# Altium footprint library JDR2812（公开）.PcbLib: 142 footprints (part 8 of 9)
Each footprint in its own frame and in the unit in brackets; x right, y up, seen from the top. Pads: shape width x height; smd on the part's side, far side on the other; paste and mask are expansions set on the pad; w line width, h text height; cw(c..) or ccw(c..) is an arc to the next point about the centre after c.
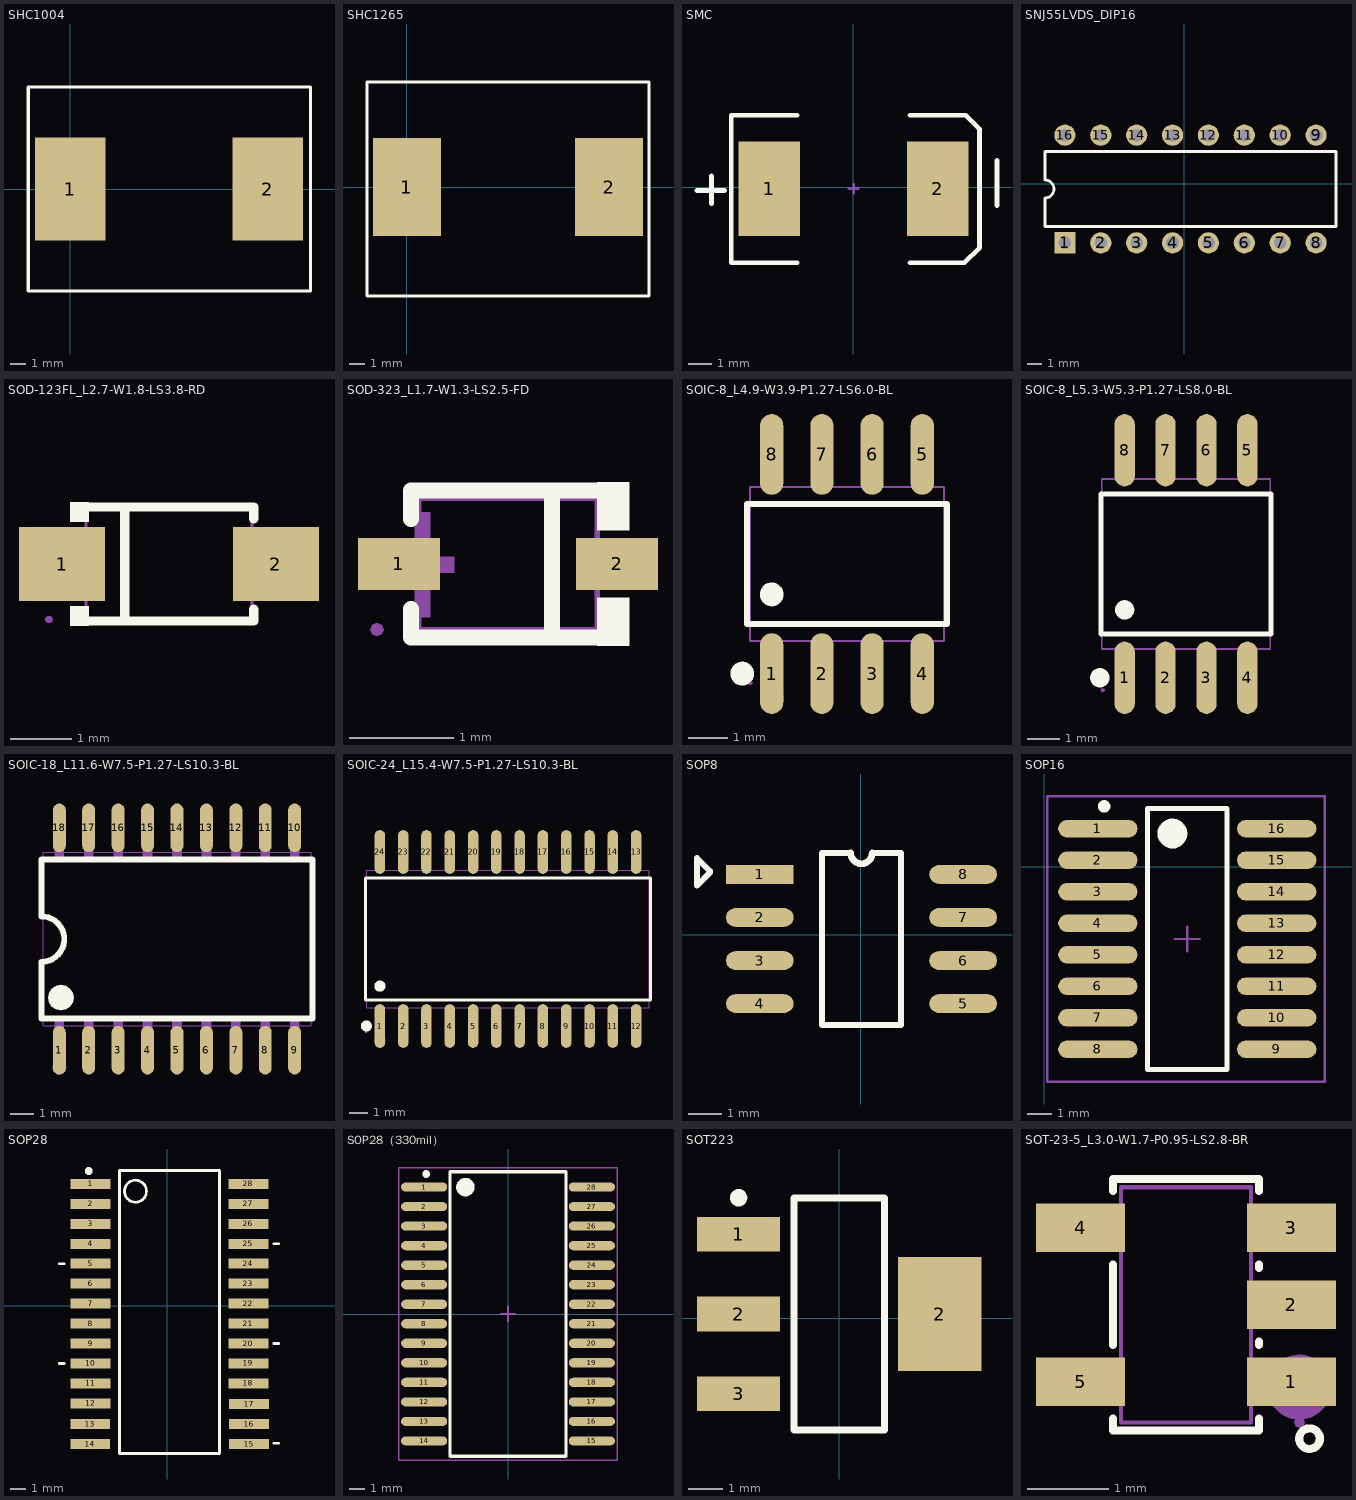
[diagram p7: the footprints below, top view; thin cyan lines are the x and y axes]

## SHC1004 [mm]
pads (2):
  rect 4.5x6.5 smd: 1(0,0) 2(12.522,0)
Top Overlay:
  lines w0.2: -2.667,-6.477 15.24,-6.477 15.24,6.477 -2.667,6.477 -2.667,-6.477

## SHC1265 [mm]
pads (2):
  rect 4.5x6.5 smd: 1(0,0) 2(13.411,0)
Top Overlay:
  lines w0.2: -2.667,-7.239 -2.667,6.985 16.078,6.985 16.078,-7.239 -2.667,-7.239

## SMC [mm]
pads (2):
  rect 2.6x4 smd: 1(-3.526,-0.051) 2(3.577,-0.051)
Top Overlay:
  lines w0.2: -6.579,-0.127 -5.41,-0.127 ; -5.969,-0.686 -5.969,0.483 ; -2.35,-3.175 -5.131,-3.175 -5.131,3.048 -2.35,3.048 ; 2.4,-3.175 4.699,-3.175 5.334,-2.54 5.334,2.462 4.754,3.048 2.4,3.048 ; 6.071,-0.762 6.071,1.143
Mechanical 1:
  lines w0.1: -0.175,-0.051 0.225,-0.051 ; 0.025,-0.251 0.025,0.149

## SNJ55LVDS_DIP16 [mm]
pads (16):
  rect 1.5x1.5 hole 0.9: 1(-8.458,-4.191)
  round 1.5 hole 0.9: 2(-5.918,-4.191) 3(-3.378,-4.191) 4(-0.838,-4.191) 5(1.702,-4.191) 6(4.242,-4.191) 7(6.782,-4.191) 8(9.322,-4.191) 9(9.322,3.429) 10(6.782,3.429) 11(4.242,3.429) 12(1.702,3.429) 13(-0.838,3.429) 14(-3.378,3.429) 15(-5.918,3.429) 16(-8.458,3.429)
Top Overlay:
  lines w0.2: -9.868,-3.031 10.732,-3.031 10.732,2.269 -9.868,2.269 -9.868,0.254 cw(c-9.868,-0.381) -9.868,-1.016 -9.868,-3.031

## SOD-123FL_L2.7-W1.8-LS3.8-RD [mm]
pads (2):
  rect 1.4x1.2 smd: 1(-1193.1,-1192.798) 2(-1189.63,-1192.798)
Top Overlay:
  region: -1192.665,-1191.795 -1192.665,-1192.115 -1192.97,-1192.115 -1192.97,-1191.795
  region: -1192.665,-1193.8 -1192.665,-1193.48 -1192.97,-1193.48 -1192.97,-1193.8
  lines w0.152: -1192.741,-1193.724 -1189.989,-1193.724 -1189.989,-1193.531 ; -1192.741,-1191.871 -1189.989,-1191.871 -1189.989,-1192.064 ; -1192.082,-1193.674 -1192.082,-1191.921
Mechanical 6:
  region: -1193.397,-1192.671 -1193.397,-1192.863 -1192.629,-1192.863 -1192.629,-1192.671
  region: -1189.33,-1192.702 -1189.33,-1192.894 -1190.098,-1192.894 -1190.098,-1192.702
  region: -1189.618,-1193.182 -1189.81,-1193.182 -1189.81,-1192.414 -1189.618,-1192.414
Mechanical 15:
  region: -1193.251,-1193.697 -1193.269,-1193.653 -1193.315,-1193.634 -1193.361,-1193.653 -1193.379,-1193.697 -1193.379,-1193.698 -1193.361,-1193.742 -1193.315,-1193.761 -1193.269,-1193.742
  region: -1189.415,-1193.273 -1190.215,-1193.273 -1190.215,-1192.323 -1189.415,-1192.323
  region: -1193.315,-1192.323 -1192.515,-1192.323 -1192.515,-1193.273 -1193.315,-1193.273
  lines w0.051: -1192.715,-1193.698 -1192.715,-1191.898 -1190.015,-1191.898 -1190.015,-1193.698 -1192.715,-1193.698

## SOD-323_L1.7-W1.3-LS2.5-FD [mm]
pads (2):
  rect 0.78x0.5 smd: 1(-1193.41,-1193.023) 2(-1191.33,-1193.023)
Top Overlay:
  region: -1191.52,-1193.343 -1191.215,-1193.343 -1191.215,-1193.8 -1191.52,-1193.8
  region: -1191.52,-1192.703 -1191.215,-1192.703 -1191.215,-1192.245 -1191.52,-1192.245
  lines w0.152: -1193.296,-1193.453 -1193.296,-1193.724 -1191.444,-1193.724 ; -1193.296,-1192.592 -1193.296,-1192.321 -1191.444,-1192.321 ; -1191.949,-1193.724 -1191.949,-1192.321
Mechanical 6:
  region: -1193.259,-1193.531 -1193.259,-1192.531 -1193.109,-1192.531 -1193.109,-1193.531
  region: -1191.054,-1193.098 -1191.054,-1192.948 -1191.654,-1192.948 -1191.654,-1193.098
  region: -1193.484,-1193.106 -1193.484,-1192.956 -1192.884,-1192.956 -1192.884,-1193.106
Mechanical 15:
  region: -1191.41,-1193.183 -1191.53,-1193.183 -1191.53,-1192.863 -1191.41,-1192.863
  region: -1191.12,-1193.183 -1191.42,-1193.183 -1191.42,-1192.863 -1191.12,-1192.863
  region: -1193.33,-1193.183 -1193.21,-1193.183 -1193.21,-1192.863 -1193.33,-1192.863
  region: -1193.62,-1193.183 -1193.32,-1193.183 -1193.32,-1192.863 -1193.62,-1192.863
  region: -1193.555,-1193.648 -1193.574,-1193.602 -1193.62,-1193.583 -1193.666,-1193.602 -1193.685,-1193.648 -1193.666,-1193.694 -1193.62,-1193.713 -1193.574,-1193.694
  lines w0.051: -1193.22,-1193.648 -1193.22,-1192.398 -1191.52,-1192.398 -1191.52,-1193.648 -1193.22,-1193.648

## SOIC-8_L4.9-W3.9-P1.27-LS6.0-BL [mm]
pads (8):
  oval 0.588x2.045 smd: 1(-1192.903,-1192.777) 2(-1191.633,-1192.777) 3(-1190.363,-1192.777) 4(-1189.093,-1192.777) 5(-1189.093,-1187.233) 6(-1190.363,-1187.233) 7(-1191.633,-1187.233) 8(-1192.903,-1187.233)
Top Overlay:
  circle w0.3: c-1192.903,-1190.774 r0.15
  circle w0.3: c-1193.65,-1192.777 r0.15
  lines w0.152: -1193.525,-1191.526 -1193.525,-1188.484 -1188.472,-1188.484 -1188.472,-1191.526 -1193.525,-1191.526
Mechanical 6:
  circle w0.3: c-1192.903,-1193.405 r0.15
Mechanical 15:
  region: -1193.384,-1193.005 -1193.403,-1192.96 -1193.448,-1192.941 -1193.494,-1192.96 -1193.513,-1193.005 -1193.494,-1193.05 -1193.448,-1193.069 -1193.403,-1193.05
  region: -1193.113,-1193.005 -1193.113,-1192.17 -1192.693,-1192.17 -1192.693,-1193.005
  region: -1193.113,-1192.18 -1193.113,-1191.945 -1192.693,-1191.945 -1192.693,-1192.18
  region: -1191.843,-1193.005 -1191.843,-1192.17 -1191.423,-1192.17 -1191.423,-1193.005
  region: -1191.843,-1192.18 -1191.843,-1191.945 -1191.423,-1191.945 -1191.423,-1192.18
  region: -1190.573,-1193.005 -1190.573,-1192.17 -1190.153,-1192.17 -1190.153,-1193.005
  region: -1190.573,-1192.18 -1190.573,-1191.945 -1190.153,-1191.945 -1190.153,-1192.18
  region: -1189.303,-1193.005 -1189.303,-1192.17 -1188.883,-1192.17 -1188.883,-1193.005
  region: -1189.303,-1192.18 -1189.303,-1191.945 -1188.883,-1191.945 -1188.883,-1192.18
  region: -1193.113,-1187.005 -1193.113,-1187.84 -1192.693,-1187.84 -1192.693,-1187.005
  region: -1193.113,-1187.83 -1193.113,-1188.065 -1192.693,-1188.065 -1192.693,-1187.83
  region: -1191.843,-1187.005 -1191.843,-1187.84 -1191.423,-1187.84 -1191.423,-1187.005
  region: -1191.843,-1187.83 -1191.843,-1188.065 -1191.423,-1188.065 -1191.423,-1187.83
  region: -1190.573,-1187.005 -1190.573,-1187.84 -1190.153,-1187.84 -1190.153,-1187.005
  region: -1190.573,-1187.83 -1190.573,-1188.065 -1190.153,-1188.065 -1190.153,-1187.83
  region: -1189.303,-1187.005 -1189.303,-1187.84 -1188.883,-1187.84 -1188.883,-1187.005
  region: -1189.303,-1187.83 -1189.303,-1188.065 -1188.883,-1188.065 -1188.883,-1187.83
  lines w0.051: -1193.448,-1191.955 -1193.448,-1188.055 -1188.548,-1188.055 -1188.548,-1191.955 -1193.448,-1191.955

## SOIC-8_L5.3-W5.3-P1.27-LS8.0-BL [mm]
pads (8):
  oval 0.63x2.25 smd: 1(-1192.883,-1192.675) 2(-1191.613,-1192.675) 3(-1190.343,-1192.675) 4(-1189.073,-1192.675) 5(-1189.073,-1185.615) 6(-1190.343,-1185.615) 7(-1191.613,-1185.615) 8(-1192.883,-1185.615)
Top Overlay:
  circle w0.3: c-1193.65,-1192.675 r0.15
  circle w0.3: c-1192.883,-1190.569 r0.15
  lines w0.152: -1193.616,-1191.321 -1188.339,-1191.321 -1188.339,-1186.969 -1193.616,-1186.969 -1193.616,-1191.321
Mechanical 6:
  circle w0.3: c-1192.883,-1193.495 r0.15
Mechanical 15:
  region: -1189.298,-1185.835 -1189.298,-1186.55 -1188.848,-1186.55 -1188.848,-1185.835
  region: -1189.298,-1185.195 -1189.298,-1185.845 -1188.848,-1185.845 -1188.848,-1185.195
  region: -1190.568,-1185.835 -1190.568,-1186.55 -1190.118,-1186.55 -1190.118,-1185.835
  region: -1190.568,-1185.195 -1190.568,-1185.845 -1190.118,-1185.845 -1190.118,-1185.195
  region: -1191.838,-1185.835 -1191.838,-1186.55 -1191.388,-1186.55 -1191.388,-1185.835
  region: -1191.838,-1185.195 -1191.838,-1185.845 -1191.388,-1185.845 -1191.388,-1185.195
  region: -1193.108,-1185.835 -1193.108,-1186.55 -1192.658,-1186.55 -1192.658,-1185.835
  region: -1193.108,-1185.195 -1193.108,-1185.845 -1192.658,-1185.845 -1192.658,-1185.195
  region: -1189.298,-1192.455 -1189.298,-1191.74 -1188.848,-1191.74 -1188.848,-1192.455
  region: -1189.298,-1193.095 -1189.298,-1192.445 -1188.848,-1192.445 -1188.848,-1193.095
  region: -1190.568,-1192.455 -1190.568,-1191.74 -1190.118,-1191.74 -1190.118,-1192.455
  region: -1190.568,-1193.095 -1190.568,-1192.445 -1190.118,-1192.445 -1190.118,-1193.095
  region: -1191.838,-1192.455 -1191.838,-1191.74 -1191.388,-1191.74 -1191.388,-1192.455
  region: -1191.838,-1193.095 -1191.838,-1192.445 -1191.388,-1192.445 -1191.388,-1193.095
  region: -1193.108,-1192.455 -1193.108,-1191.74 -1192.658,-1191.74 -1192.658,-1192.455
  region: -1193.108,-1193.095 -1193.108,-1192.445 -1192.658,-1192.445 -1192.658,-1193.095
  region: -1193.498,-1193.065 -1193.517,-1193.019 -1193.563,-1193 -1193.609,-1193.019 -1193.628,-1193.065 -1193.609,-1193.111 -1193.563,-1193.13 -1193.517,-1193.111
  lines w0.051: -1193.593,-1191.785 -1188.363,-1191.785 -1188.363,-1186.505 -1193.593,-1186.505 -1193.593,-1191.785

## SOIC-18_L11.6-W7.5-P1.27-LS10.3-BL [mm]
pads (18):
  oval 0.56x2.1 smd: 1(-1193.038,-1192.75) 2(-1191.768,-1192.75) 3(-1190.498,-1192.75) 4(-1189.228,-1192.75) 5(-1187.958,-1192.75) 6(-1186.688,-1192.75) 7(-1185.418,-1192.75) 8(-1184.148,-1192.75) 9(-1182.878,-1192.75) 10(-1182.878,-1183.15) 11(-1184.148,-1183.15) 12(-1185.418,-1183.15) 13(-1186.688,-1183.15) 14(-1187.958,-1183.15) 15(-1189.228,-1183.15) 16(-1190.498,-1183.15) 17(-1191.768,-1183.15) 18(-1193.038,-1183.15)
Top Overlay:
  region: -1193.518,-1190.48 -1193.519,-1190.476 -1193.477,-1190.265 -1193.357,-1190.087 -1193.179,-1189.968 -1192.968,-1189.926 -1192.757,-1189.968 -1192.579,-1190.087 -1192.459,-1190.265 -1192.417,-1190.476 -1192.418,-1190.48 -1192.417,-1190.484 -1192.459,-1190.694 -1192.579,-1190.873 -1192.757,-1190.992 -1192.968,-1191.034 -1193.179,-1190.992 -1193.357,-1190.873 -1193.477,-1190.694 -1193.519,-1190.484
  lines w0.254: -1193.8,-1188.961 -1193.8,-1191.379 -1182.116,-1191.379 -1182.116,-1184.521 -1193.8,-1184.521 -1193.8,-1186.977 cw(c-1193.8,-1187.955) -1193.8,-1188.933
Mechanical 6:
  circle w0.3: c-1193.038,-1193.5 r0.15
Mechanical 15:
  drawing of 41 lines, arcs and shapes, not listed

## SOIC-24_L15.4-W7.5-P1.27-LS10.3-BL [mm]
pads (24):
  oval 0.574x2.388 smd: 1(-1192.91,-1192.606) 2(-1191.64,-1192.606) 3(-1190.37,-1192.606) 4(-1189.1,-1192.606) 5(-1187.83,-1192.606) 6(-1186.56,-1192.606) 7(-1185.29,-1192.606) 8(-1184.02,-1192.606) 9(-1182.75,-1192.606) 10(-1181.48,-1192.606) 11(-1180.21,-1192.606) 12(-1178.94,-1192.606) 13(-1178.94,-1183.118) 14(-1180.21,-1183.118) 15(-1181.48,-1183.118) 16(-1182.75,-1183.118) 17(-1184.02,-1183.118) 18(-1185.29,-1183.118) 19(-1186.56,-1183.118) 20(-1187.83,-1183.118) 21(-1189.1,-1183.118) 22(-1190.37,-1183.118) 23(-1191.64,-1183.118) 24(-1192.91,-1183.118)
Top Overlay:
  circle w0.3: c-1192.91,-1190.431 r0.15
  circle w0.3: c-1193.65,-1192.606 r0.15
  lines w0.152: -1193.702,-1191.183 -1193.702,-1184.541 -1178.149,-1184.541 -1178.149,-1191.183 -1193.702,-1191.183
Mechanical 6:
  circle w0.3: c-1192.91,-1193.412 r0.15
Mechanical 15:
  drawing of 53 lines, arcs and shapes, not listed

## SOP8 [mm]
pads (8):
  rect 2x0.55 smd: 1(-2.972,1.778)
  oval 2x0.55 smd: 2(-2.972,0.508) 3(-2.972,-0.762) 4(-2.972,-2.032) 5(3.028,-2.032) 6(3.028,-0.762) 7(3.028,0.508) 8(3.028,1.778)
Top Overlay:
  lines w0.178: -4.445,1.829 -4.826,1.448 -4.826,2.261 -4.445,1.88 ; -0.289,2.413 -1.137,2.413 -1.137,-2.667 1.193,-2.667 1.193,2.413 0.346,2.413
  lines w0.2: -0.289,2.413 ccw(c0.028,2.413) 0.346,2.413

## SOP16 [mm]
pads (16):
  oval 3.2x0.7 smd: 1(2.162,1.524) 2(2.162,0.254) 3(2.162,-1.016) 4(2.162,-2.286) 5(2.162,-3.556) 6(2.162,-4.826) 7(2.162,-6.096) 8(2.162,-7.366) 9(9.37,-7.366) 10(9.37,-6.096) 11(9.37,-4.826) 12(9.37,-3.556) 13(9.37,-2.286) 14(9.37,-1.016) 15(9.37,0.254) 16(9.37,1.524)
Top Overlay:
  circle w0.25: c2.416,2.424 r0.125
  circle w0.6: c5.166,1.329 r0.3
  lines w0.2: 4.166,-8.171 4.166,2.329 7.366,2.329 7.366,-8.171 4.166,-8.171
Mechanical 15:
  lines w0.1: 5.266,-2.921 6.266,-2.921 ; 5.766,-3.421 5.766,-2.421 ; 0.127,-8.671 0.127,2.829 11.303,2.829 11.303,-8.671 0.127,-8.671

## SOP28 [mil]
pads (28):
  rect 100x25 smd: 1(-192,305) 2(-192,255) 3(-192,205) 4(-192,155) 5(-192,105) 6(-192,55) 7(-192,5) 8(-192,-45) 9(-192,-95) 10(-192,-145) 11(-192,-195) 12(-192,-245) 13(-193,-297) 14(-193,-347) 15(205,-347) 16(205,-297) 17(205,-247) 18(203.28,-195) 19(203.28,-145) 20(203.28,-95) 21(203.28,-45) 22(203.28,5) 23(203.28,55) 24(203.28,105) 25(203.28,155) 26(203.28,205) 27(203.28,255) 28(203.28,305)
Top Overlay:
  circle w9.84: c-196.94,337.28 r4.92
  circle w7: c-79.56,286.75 r27.56
  lines w7: -270.86,-145 -258.36,-145 ; -270.86,105 -258.36,105 ; 267.14,-345 279.64,-345 ; 267.14,-95 279.64,-95 ; 267.14,155 279.64,155 ; -119.36,-371 -119.36,339 130.64,339 130.64,-371 -119.36,-371

## SOP28（330mil） [mm] "SOP, 28-Leads, Body 18.5x8.6mm (max), Pitch 1.27mm, IPC Medium Density"
height 2.65
pads (28):
  oval 3x0.6 smd: 1(-5.452,8.255) 2(-5.452,6.985) 3(-5.452,5.715) 4(-5.452,4.445) 5(-5.452,3.175) 6(-5.452,1.905) 7(-5.452,0.635) 8(-5.452,-0.635) 9(-5.452,-1.905) 10(-5.452,-3.175) 11(-5.452,-4.445) 12(-5.452,-5.715) 13(-5.452,-6.985) 14(-5.452,-8.255) 15(5.452,-8.255) 16(5.452,-6.985) 17(5.452,-5.715) 18(5.452,-4.445) 19(5.452,-3.175) 20(5.452,-1.905) 21(5.452,-0.635) 22(5.452,0.635) 23(5.452,1.905) 24(5.452,3.175) 25(5.452,4.445) 26(5.452,5.715) 27(5.452,6.985) 28(5.452,8.255)
Top Overlay:
  circle w0.6: c-2.775,8.25 r0.3
  circle w0.25: c-5.325,9.105 r0.125
  lines w0.2: -3.775,-9.25 3.775,-9.25 3.775,9.25 -3.775,9.25 -3.775,-9.25
Mechanical 15:
  lines w0.1: -0.5,0 0.5,0 ; 0,-0.5 0,0.5 ; -7.112,-9.5 7.112,-9.5 7.112,9.5 -7.112,9.5 -7.112,-9.5

## SOT223 [mm]
pads (4):
  rect 2.4x1 smd: 1(-2.9,2.427) 2(-2.9,0.127) 3(-2.9,-2.173)
  rect 2.4x3.3 smd: 2(2.9,0.127)
Top Overlay:
  circle w0.25: c-2.9,3.477 r0.125
  lines w0.2: -1.3,-3.223 1.3,-3.223 1.3,3.477 -1.3,3.477 -1.3,-3.223

## SOT-23-5_L3.0-W1.7-P0.95-LS2.8-BR [mm]
pads (5):
  rect 1.1x0.6 smd: 1(-1190.65,-1192.972) 2(-1190.65,-1192.022) 3(-1190.65,-1191.072) 4(-1193.25,-1191.072) 5(-1193.25,-1192.972)
Top Overlay:
  circle w0.1: c-1190.426,-1193.673 r0.127
  lines w0.1: -1192.85,-1193.426 -1192.85,-1193.572 -1191.05,-1193.572 -1191.05,-1193.426 ; -1192.85,-1192.518 -1192.85,-1191.526 ; -1192.85,-1190.618 -1192.85,-1190.472 -1191.05,-1190.472 -1191.05,-1190.618 ; -1191.05,-1192.518 -1191.05,-1192.476 ; -1191.05,-1191.568 -1191.05,-1191.526
Mechanical 6:
  circle w0.4: c-1190.553,-1193.038 r0.2
Mechanical 15:
  region: -1190.485,-1193.472 -1190.504,-1193.426 -1190.55,-1193.407 -1190.596,-1193.426 -1190.615,-1193.472 -1190.596,-1193.518 -1190.55,-1193.537 -1190.504,-1193.518
  region: -1191.16,-1193.172 -1191.16,-1192.772 -1190.99,-1192.772 -1190.99,-1193.172
  region: -1191,-1193.172 -1191,-1192.772 -1190.55,-1192.772 -1190.55,-1193.172
  region: -1191.16,-1192.222 -1191.16,-1191.822 -1190.99,-1191.822 -1190.99,-1192.222
  region: -1191,-1192.222 -1191,-1191.822 -1190.55,-1191.822 -1190.55,-1192.222
  region: -1191.16,-1191.272 -1191.16,-1190.872 -1190.99,-1190.872 -1190.99,-1191.272
  region: -1191,-1191.272 -1191,-1190.872 -1190.55,-1190.872 -1190.55,-1191.272
  region: -1192.91,-1191.272 -1192.91,-1190.872 -1192.74,-1190.872 -1192.74,-1191.272
  region: -1193.35,-1191.272 -1193.35,-1190.872 -1192.9,-1190.872 -1192.9,-1191.272
  region: -1192.91,-1193.172 -1192.91,-1192.772 -1192.74,-1192.772 -1192.74,-1193.172
  region: -1193.35,-1193.172 -1193.35,-1192.772 -1192.9,-1192.772 -1192.9,-1193.172
  lines w0.051: -1192.75,-1193.472 -1191.15,-1193.472 -1191.15,-1190.572 -1192.75,-1190.572 -1192.75,-1193.472